# Altium integrated library Miscellaneous Devices LC.IntLib: 334 symbols (part 3 of 3)
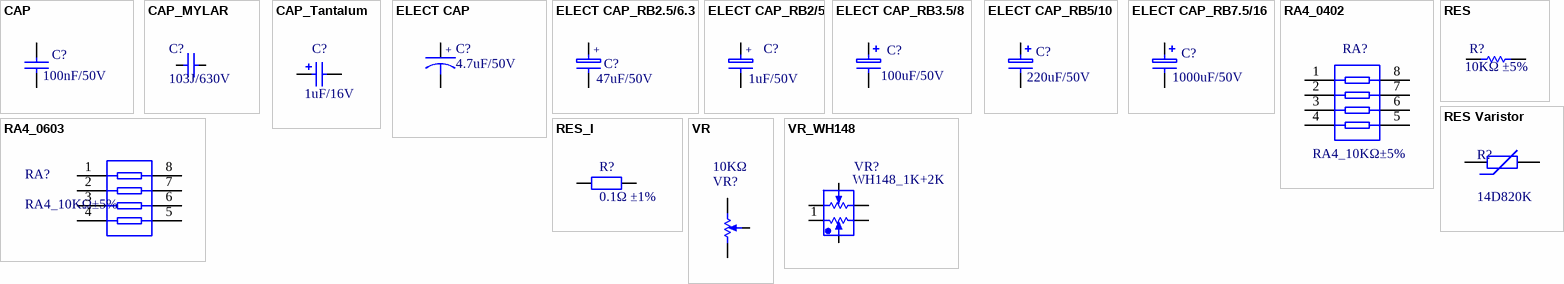
[diagram p33: symbols CAP to VR_WH148]

## ELECT CAP_RB3.5/8 
designator C?, comment 100uF/50V
电解电容
footprint RB3.5/8
pins: 1, 2

## ELECT CAP_RB5/10 
designator C?, comment 220uF/50V
电解电容
footprint RB5/10
pins: 1, 2

## ELECT CAP_RB7.5/16 
designator C?, comment 1000uF/50V
电解电容
footprint RB7.5/16
pins: 1, 2

## RA4_0402
designator RA?, comment RA4_10KΩ±5%
贴片排阻; ComponentLink1Description: 供应商链接; ComponentLink1URL: http://www.szlcsc.com/product/details_26468.html; Package: 0402*4; Supplier: LC; SuppliersPartNumber: C25725
footprint 0402_Rx4
pins: 1, 2, 3, 4, 5, 6, 7, 8

## RA4_0603
designator RA?, comment RA4_10KΩ±5%
贴片排阻; ComponentLink1Description: 供应商链接; ComponentLink1URL: http://www.szlcsc.com/product/details_30472.html; Package: 0603*4; Supplier: LC; SuppliersPartNumber: C29718
footprint 0603_Rx4
pins: 1, 2, 3, 4, 5, 6, 7, 8

## RES
designator R?, comment 10KΩ ±5%
贴片电阻; value: 1k
footprint 0805_R
footprint 0402_R
footprint 0603_R
footprint 1206_R
footprint AXIAL0.4-10mm
pins: 1, 2

## RES Varistor
designator R?, comment 14D820K
压敏电阻; Published: 24-Mar-1999; LatestRevisionDate: 29-May-2009; LatestRevisionNote: IPC-7351 Footprint Added.; PackageVersion: Mar-2003; PackageReference: 6-0805; Publisher: Altium Limited; PackageDescription: Chip Resistor 0805 Case Size; Code_IPC: RESC2012
footprint 14DXXXK
pins: 1, 2

## RES_I
designator R?, comment 0.1Ω ±1%
贴片取样电阻; ComponentLink1Description: 供应商链接; ComponentLink1URL: http://www.szlcsc.com/product/details_18590.html; Package: 1206; Supplier: LC; SuppliersPartNumber: C17902
footprint 1206_R
footprint 2512_R
footprint 1210_R
pins: 1, 2

## VR
designator VR?, comment 10KΩ
可调电阻; ComponentLink1Description: 生产商链接; ComponentLink1URL: http://www.bochen-gs.com/products_detail/productId=266.html
footprint VR_3362P (BOCHEN_3362P)
footprint VR5
footprint VR2
footprint VR_3296W
pins: 1, 2, 3

## VR_WH148
designator VR?, comment WH148_1K+2K
B型双联电位器; ComponentLink1Description: 生产商链接; ComponentLink1URL: http://www.bochen-gs.com/products_detail/productId=266.html
footprint CZ_B
footprint CZA100067
pins: 1, 2, 3, 4, 5, 6


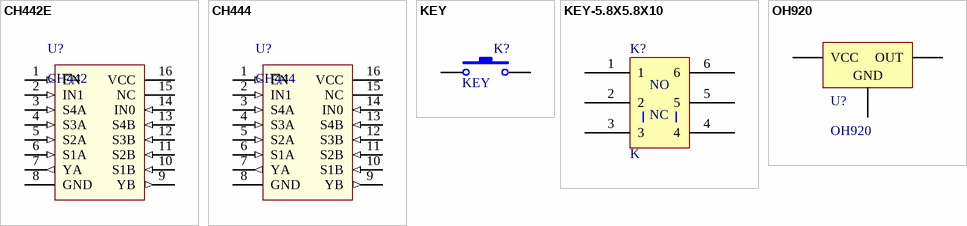
[diagram p24: symbols CH442E to OH920]

## CH442E
designator U?, comment CH442
2 路 2选1模拟开关
footprint SOP-16_150mil_W
pins: 1 ~{E}N (in), 2 IN1 (in), 3 S4A (in), 4 S3A (in), 5 S2A (in), 6 S1A (in), 7 YA (out), 8 GND (power), 9 YB (out), 10 S1B (in), 11 S2B (in), 12 S3B (in), 13 S4B (in), 14 IN0 (in), 15 NC, 16 VCC (power)

## CH444
designator U?
2 通道四选1模拟开关; ComponentLink1Description: 贸易商; ComponentLink1URL: https://item.szlcsc.com/87590.html; ComponentLink2Description: 南京沁恒; ComponentLink2URL: http://wch.cn/products/CH440_2_3_4.html
footprint SOP-16_150mil_W
pins: 1 ~{E}N (in), 2 IN1 (in), 3 S4A (in), 4 S3A (in), 5 S2A (in), 6 S1A (in), 7 YA (out), 8 GND (power), 9 YB (out), 10 S1B (in), 11 S2B (in), 12 S3B (in), 13 S4B (in), 14 IN0 (in), 15 NC, 16 VCC (power)

## KEY
designator K?
Published: 24-Mar-1999; LatestRevisionDate: 17-Jul-2002
footprint KEY
pins: 1, 2
2 alternate drawings of the same symbol

## KEY-5.8X5.8X10
designator K?, comment K
5.8mm*5.8mm*10mm
footprint KEY-5.8X5.8 (按键开关带自锁)
pins: 1, 2, 3, 4, 5, 6
text: NO; NC

## OH920
designator U?
霍尔开关; ComponentLink1Description: 供应商链接; ComponentLink1URL: http://www.szlcsc.com/product/details_5896.html; Package: SOT-23; Supplier: LC; SuppliersPartNumber: C5446
footprint SOT-23-3L (http://www.aosmd.com/res/packaging_information/SOT-23-3L.pdf)
pins: 1 VCC, 2 OUT, 3 GND


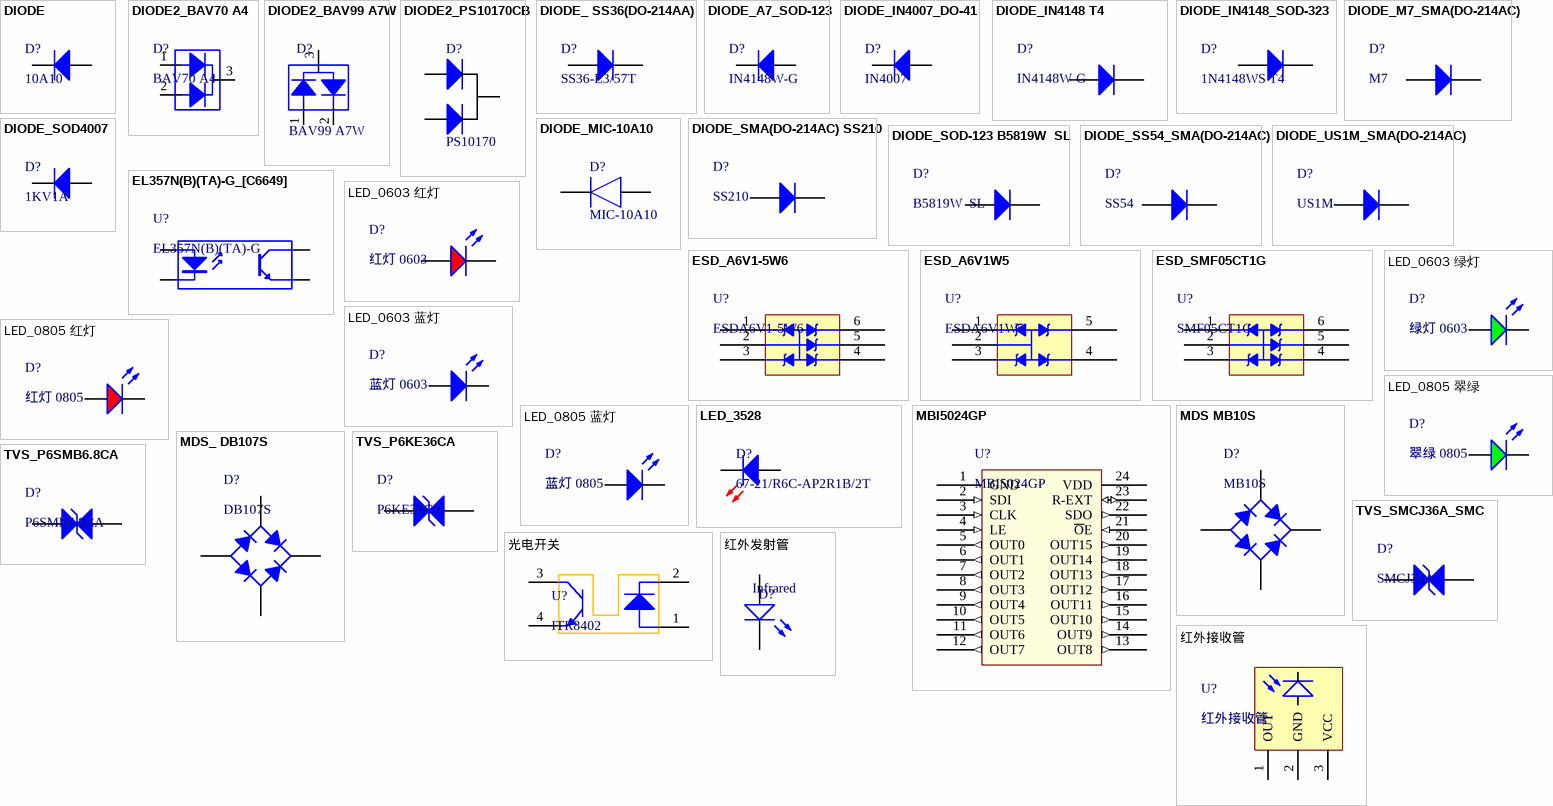
[diagram p25: symbols DIODE to 红外接收管]

## DIODE
designator D?, comment 10A10
二极管; 备注: 1N4007 4007 编号C2464 已经停售, 使用新物料编号C95872; ComponentLink1Description: 供应商链接; ComponentLink1URL: http://www.szlcsc.com/product/details_2841.html; Package: SMA(DO-214AC); Supplier: LC; SuppliersPartNumber: C95872
footprint R-6-17MM
pins: 1 A, 2 K

## DIODE2_BAV70 A4
designator D?, comment BAV70 A4
开关二极管; ComponentLink1Description: 供应商链接; ComponentLink1URL: http://www.szlcsc.com/product/details_70091.html; Package: SOT-23; Supplier: LC; SuppliersPartNumber: C68978
footprint SOT-23-3W
pins: 1 A, 2 A, 3 K

## DIODE2_BAV99 A7W
designator D?, comment BAV99 A7W
开关二极管; ComponentLink1Description: 供应商链接; ComponentLink1URL: http://www.szlcsc.com/product/details_2877.html; Package: SOT-23; Supplier: LC; SuppliersPartNumber: C2500
footprint SOT-23-3W
pins: 1 A, 2 A, 3 K

## DIODE2_PS10170CB
designator D?, comment PS10170
复合二极管; ComponentLink1Description: 网络链接; ComponentLink1URL: http://item.szlcsc.com/166994.html
footprint TO-252-2
pins: 1, 2, 3

## DIODE_ SS36(DO-214AA)
designator D?, comment SS36-E3/57T
二极管; ComponentLink1Description: 供应商链接; ComponentLink1URL: http://www.szlcsc.com/product/details_36698.html; Package: SMC(DO-214AB); Supplier: LC; SuppliersPartNumber: C35722
footprint DO-214AA/SMB
pins: 1 A, 2 K

## DIODE_A7_SOD-123
designator D?, comment IN4148W-G
开关二极管; 备注: 1N4007 4007 编号C2464 已经停售, 使用新物料编号C95872; ComponentLink1Description: 供应商链接; ComponentLink1URL: http://www.szlcsc.com/product/details_2841.html; Package: SMA(DO-214AC); Supplier: LC; SuppliersPartNumber: C95872
footprint SOD-123
pins: 1 A, 2 K

## DIODE_IN4007_DO-41
designator D?, comment IN4007
二极管
footprint DO-41
pins: 1 A, 2 K

## DIODE_IN4148 T4
designator D?, comment IN4148W-G
开关二极管; ComponentLink1Description: 供应商链接; ComponentLink1URL: http://www.szlcsc.com/product/details_10338.html; Package: LL-34; Supplier: LC; SuppliersPartNumber: C9808
footprint LL-34
pins: 1 A, 2 K

## DIODE_IN4148_SOD-323
designator D?, comment 1N4148WS T4
二极管; ComponentLink1Description: 供应商链接; ComponentLink1URL: http://www.szlcsc.com/product/details_2485.html; Package: SOD-323; Supplier: LC; SuppliersPartNumber: C2128
footprint SOD-323
pins: 1 A, 2 K

## DIODE_M7_SMA(DO-214AC)
designator D?, comment M7
二极管; 备注: 1N4007 4007 编号C2464 已经停售, 使用新物料编号C95872; ComponentLink1Description: 供应商链接; ComponentLink1URL: http://www.szlcsc.com/product/details_2841.html; Package: SMA(DO-214AC); Supplier: LC; SuppliersPartNumber: C95872
footprint SMA(DO-214AC)
pins: 1 A, 2 K

## DIODE_MIC-10A10
designator D?, comment MIC-10A10
Diode 10A 1000V; Manufacturer_Name: STMicroelectronics; Manufacturer_Part_Number: BZW50-27; Allied_Number: 70389896; RS Part Number: 7147033; RS Price/Stock: http://uk.rs-online.com/web/p/tvs-diodes/7147033/?source=DS; Allied Price/Stock: http://www.alliedelec.com/stmicroelectronics-bzw50-27/70389896/; Arrow Part Number: BZW50-27; Arrow Price/Stock: https://www.arrow.com/en/products/bzw50-27/stmicroelectronics; Datasheet Link: http://www.st.com/web/en/resource/technical/document/datasheet/CD00000695.pdf
footprint R-6
pins: 1 K, 2 A

## DIODE_SMA(DO-214AC) SS210
designator D?, comment SS210
二极管; ComponentLink1Description: 供应商链接; ComponentLink1URL: http://www.szlcsc.com/product/details_15669.html; Package: SMA(DO-214AC); Supplier: LC; SuppliersPartNumber: C14996
footprint SMA(DO-214AC)_S1
pins: 1 A, 2 K

## DIODE_SOD4007
designator D?, comment 1KV1A
二极管; 备注: 1N4007 4007 编号C2464 已经停售, 使用新物料编号C95872; Package: SMA(DO-214AC); Supplier: LC; SuppliersPartNumber: C95872; ComponentLink1Description: 供应商; ComponentLink1URL: https://so.szlcsc.com/global.html?os=&sb=0&pn=1&c=&k=4007&tc=0&pds=SOD-123F&pa=0&gp=211&st=&sk=4007&bp=&ep=&pageNumber=1
footprint SOD-123F_A7
pins: 1 A, 2 K

## DIODE_SOD-123 B5819W  SL
designator D?, comment B5819W  SL
肖特基二极管; ComponentLink1Description: 供应商链接; ComponentLink1URL: http://www.szlcsc.com/product/details_9093.html; Package: SOD-123; Supplier: LC; SuppliersPartNumber: C8598
footprint SOD-123
pins: 1 A, 2 K

## DIODE_SS54_SMA(DO-214AC)
designator D?, comment SS54
二极管; ComponentLink1Description: 供应商链接; ComponentLink1URL: http://www.szlcsc.com/product/details_23178.html; Package: SMA(DO-214AC); Supplier: LC; SuppliersPartNumber: C22452
footprint SMA(DO-214AC)_S1
pins: 1 A, 2 K

## DIODE_US1M_SMA(DO-214AC)
designator D?, comment US1M
二极管; ComponentLink1Description: 供应商链接; ComponentLink1URL: http://www.szlcsc.com/product/details_5885.html; Package: SMA(DO-214AC); Supplier: LC; SuppliersPartNumber: C5441
footprint SMA(DO-214AC)_S1
pins: 1 A, 2 K

## EL357N(B)(TA)-G_[C6649]
designator U?, comment EL357N(B)(TA)-G
贴片光耦; ComponentLink1Description: 供应商链接; ComponentLink1URL: http://www.szlcsc.com/product/details_7114.html; Package: SOP-4_P2.54; Supplier: LC; SuppliersPartNumber: C6649
footprint SOP-4_P2.54
pins: 1 A "Anode", 2 K "Cathode", 3 E "Emitter", 4 C "Collector"

## ESD_A6V1-5W6
designator U?, comment ESDA6V1-5W6
ESD静电保护管; ComponentLink1Description: 供应商链接; ComponentLink1URL: http://www.szlcsc.com/product/details_16561.html; Package: SC-70-6(SOT-363); Supplier: LC; SuppliersPartNumber: C15879
footprint SOT-323-6L (E62)
pins: 1, 2, 3, 4, 5, 6

## ESD_A6V1W5
designator U?, comment ESDA6V1W5
ESD静电保护管; Package: SC-70-6(SOT-363); Supplier: LC; SuppliersPartNumber: C15879; ComponentLink1Description: 供应商; ComponentLink1URL: https://item.szlcsc.com/49685.html
footprint SOT-323-5L (E61)
pins: 1, 2, 3, 4, 5

## ESD_SMF05CT1G
designator U?, comment SMF05CT1G
ESD静电保护管; ComponentLink1Description: 供应商链接; ComponentLink1URL: http://www.szlcsc.com/product/details_16561.html; Package: SC-70-6(SOT-363); Supplier: LC; SuppliersPartNumber: C15879
footprint SC-70-6(SOT-363)
pins: 1, 2, 3, 4, 5, 6

## LED_0603 红灯
designator D?, comment 红灯 0603
发光二极管; ComponentLink1Description: 供应商链接; ComponentLink1URL: http://www.szlcsc.com/product/details_2659.html; Package: 0603; Supplier: LC; SuppliersPartNumber: C2286
footprint 0603_LED
pins: A, K

## LED_0603 绿灯
designator D?, comment 绿灯 0603
发光二极管; ComponentLink1Description: 供应商链接; ComponentLink1URL: http://www.szlcsc.com/product/details_73152.html; Package: 0603; Supplier: LC; SuppliersPartNumber: C72043
footprint 0603_LED
pins: A, K

## LED_0603 蓝灯
designator D?, comment 蓝灯 0603
发光二极管; ComponentLink1Description: 供应商链接; ComponentLink1URL: http://www.szlcsc.com/product/details_73150.html; Package: 0603; Supplier: LC; SuppliersPartNumber: C72041
footprint 0603_LED
pins: A, K

## LED_0805 红灯
designator D?, comment 红灯 0805
发光二极管; ComponentLink1Description: 供应商链接; ComponentLink1URL: http://www.szlcsc.com/product/details_2668.html; Package: 0805; Supplier: LC; SuppliersPartNumber: C2295
footprint 0805_LED_S1
footprint LED 5MM RED
pins: A, K

## LED_0805 翠绿
designator D?, comment 翠绿 0805
发光二极管; ComponentLink1Description: 供应商链接; ComponentLink1URL: http://www.szlcsc.com/product/details_2670.html; Package: 0805; Supplier: LC; SuppliersPartNumber: C2297
footprint 0805_LED_S1
pins: A, K

## LED_0805 蓝灯
designator D?, comment 蓝灯 0805
发光二极管; ComponentLink1Description: 供应商链接; ComponentLink1URL: http://www.szlcsc.com/product/details_2666.html; Package: 0805; Supplier: LC; SuppliersPartNumber: C2293
footprint 0805_LED_S1
pins: A, K

## LED_3528
designator D?, comment 67-21/R6C-AP2R1B/2T
发光二极管; ComponentLink1Description: 供应商链接; ComponentLink1URL: https://item.szlcsc.com/75469.html; Package: 0805; Supplier: LC; SuppliersPartNumber: C2293; ComponentLink2Description: 生产商; ComponentLink2URL: https://www.everlight.com/SeriationProduct.aspx?Seq=B3D6B83A-2405-E411-8B3B-0002A54E500F
footprint 3528X19N_LED (Molded Diode, 2-Leads, Body 3.10x2.20mm, IPC Medium Density)
footprint LED 5MM RED
pins: A, K

## MBI5024GP
designator U?
LED驱动; ComponentLink1Description: 贸易商; ComponentLink1URL: https://item.szlcsc.com/83753.html
footprint SSOP-24L-150mil-0.64 (SOP, 24-Leads, Body 8.65x3.90mm, Pitch 0.64mm, IPC High Density)
pins: 1 GND (power), 2 SDI (in), 3 CLK (in), 4 LE (in), 5 OUT0 (out), 6 OUT1 (out), 7 OUT2 (out), 8 OUT3 (out), 9 OUT4 (out), 10 OUT5 (out), 11 OUT6 (out), 12 OUT7 (out), 13 OUT8 (out), 14 OUT9 (out), 15 OUT10 (out), 16 OUT11 (out), 17 OUT12 (out), 18 OUT13 (out), 19 OUT14 (out), 20 OUT15 (out), 21 ~{O}E (in), 22 SDO (out), 23 R-EXT (io), 24 VDD (power)

## MDS MB10S
designator D?, comment MB10S
整流桥; ComponentLink1Description: 供应商链接; ComponentLink1URL: http://www.szlcsc.com/product/details_2865.html; Package: MBS; Supplier: LC; SuppliersPartNumber: C2488
footprint MBS
pins: 1 C, 2 K, 3 C, 4 A

## MDS_ DB107S
designator D?, comment DB107S
整流桥; ComponentLink1Description: 供应商链接; ComponentLink1URL: http://www.szlcsc.com/product/details_5809.html; Package: DBS; Supplier: LC; SuppliersPartNumber: C5377
footprint DBS
pins: 1 C, 2 K, 3 C, 4 A

## TVS_P6KE36CA
designator D?, comment P6KE36CA
ComponentLink1Description: 供应商链接; ComponentLink1URL: http://www.szlcsc.com/product/details_79530.html; Package: SMB/DO-214AA; Supplier: LC; SuppliersPartNumber: C78395
footprint DO-15
pins: 1 A, 2 K

## TVS_P6SMB6.8CA
designator D?, comment P6SMB6.8CA
TVS SMB/DO-214AA; ComponentLink1Description: 供应商链接; ComponentLink1URL: http://www.szlcsc.com/product/details_79530.html; Package: SMB/DO-214AA; Supplier: LC; SuppliersPartNumber: C78395
footprint SMB(DO-214AA)
pins: 1 A, 2 K

## TVS_SMCJ36A_SMC
designator D?, comment SMCJ36A
ComponentLink1Description: 供应商链接; ComponentLink1URL: http://www.szlcsc.com/product/details_79530.html; Package: SMB/DO-214AA; Supplier: LC; SuppliersPartNumber: C78395
footprint SMB(DO-214AA)_S1
pins: 1 A, 2 K

## 光电开关
designator U?, comment ITR8402
ComponentLink1Description: 供应商链接; ComponentLink1URL: http://www.szlcsc.com/product/details_73150.html; Package: 0603; Supplier: LC; SuppliersPartNumber: C72041
footprint DIP-4_ITR8402 (光电开关)
pins: 1 A, 2 K, 3 C, 4 E

## 红外发射管
designator D?, comment Infrared
footprint RB01/02 (红外发射管)
pins: A, K

## 红外接收管
designator U?
ComponentLink1Description: 供应商链接; ComponentLink1URL: http://www.szlcsc.com/product/details_2663.html; Package: 0603; Supplier: LC; SuppliersPartNumber: C2290
footprint 红外接收管
pins: 1 OUT, 2 GND, 3 VCC


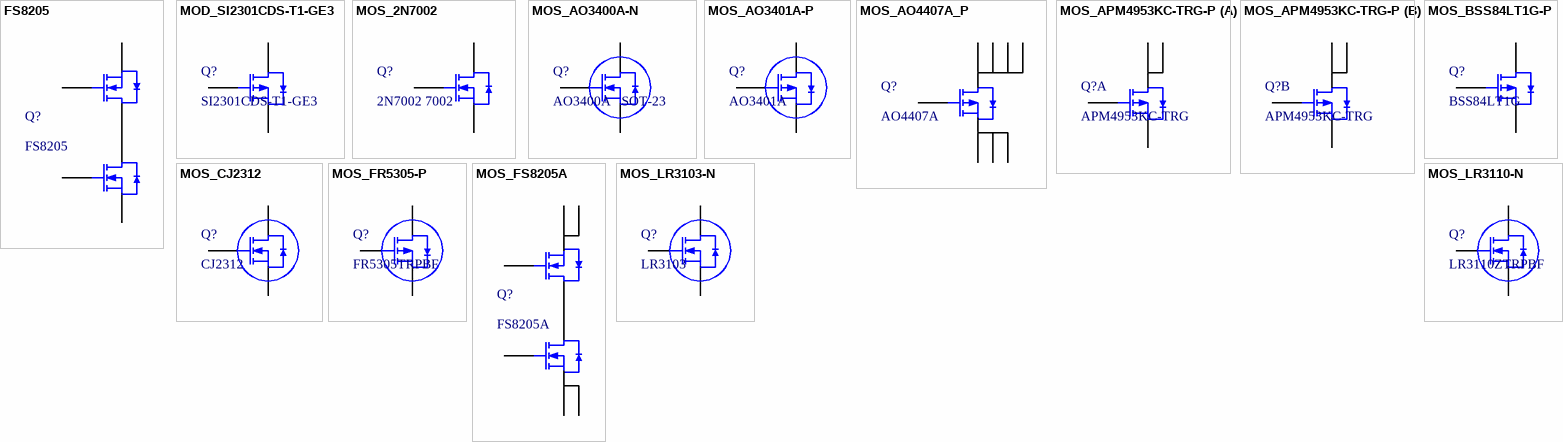
[diagram p26: symbols FS8205 to MOS_LR3110-N]

## FS8205
designator Q?
MOS(场效应管); ComponentLink1Description: 供应商链接; ComponentLink1URL: http://www.szlcsc.com/product/details_33217.html; Package: SOT-23-6; Supplier: LC; SuppliersPartNumber: C32254
footprint SOT-23-6
pins: 1 S, 2 D, 3 S, 4 G, 5 D, 6 G

## MOD_SI2301CDS-T1-GE3
designator Q?, comment SI2301CDS-T1-GE3
MOS(场效应管); ComponentLink1Description: 供应商链接; ComponentLink1URL: http://www.szlcsc.com/product/details_11030.html; Package: SOT-23(SOT-23-3); Supplier: LC; SuppliersPartNumber: C10487
footprint SOT-23(SOT-23-3)
pins: 1 G, 2 S, 3 D

## MOS_2N7002
designator Q?, comment 2N7002 7002
MOS(场效应管); ComponentLink1Description: 供应商链接; ComponentLink1URL: http://www.szlcsc.com/product/details_9040.html; Package: SOT-23(SOT-23-3); Supplier: LC; SuppliersPartNumber: C8545
footprint SOT-23-3
pins: 1 G, 2 S, 3 D

## MOS_AO3400A-N
designator Q?, comment AO3400A   SOT-23
MOS(场效应管)AO3400A N道沟 X0YV1T SOT-23; ComponentLink1Description: 供应商链接; ComponentLink1URL: http://www.szlcsc.com/product/details_21629.html; Package: SOT-23; Supplier: LC; SuppliersPartNumber: C20917
footprint SOT-23-3L (http://www.aosmd.com/res/packaging_information/SOT-23-3L.pdf)
pins: 1 G, 2 S, 3 D

## MOS_AO3401A-P
designator Q?, comment AO3401A
PMOS(场效应管)AO3401A P道沟 X13A15 SOT-23; ComponentLink1Description: 供应商链接; ComponentLink1URL: http://www.szlcsc.com/product/details_15801.html; Package: SOT-23; Supplier: LC; SuppliersPartNumber: C15127
footprint SOT-23-3L (http://www.aosmd.com/res/packaging_information/SOT-23-3L.pdf)
pins: 1 G, 2 S, 3 D

## MOS_AO4407A_P
designator Q?, comment AO4407A
MOS(场效应管); ComponentLink1Description: 供应商链接; ComponentLink1URL: http://www.szlcsc.com/product/details_16754.html; Package: SOIC-8_150mil; Supplier: LC; SuppliersPartNumber: C16072
footprint SOIC-8_150mil
pins: 1 S, 2 S, 3 S, 4 G, 5 D, 6 D, 7 D, 8 D

## MOS_APM4953KC-TRG-P
designator Q?, comment APM4953KC-TRG
MOS(场效应管); ComponentLink1Description: 供应商链接; ComponentLink1URL: http://www.szlcsc.com/product/details_21609.html; Package: SOP-8_150mil; Supplier: LC; SuppliersPartNumber: C20897
footprint SOP-8_150mil
part A pins: 1 S, 2 G, 7 D, 8 D
part B pins: 3 S, 4 G, 5 D, 6 D

## MOS_BSS84LT1G-P
designator Q?, comment BSS84LT1G
MOS(场效应管); ComponentLink1Description: 供应商链接; ComponentLink1URL: http://www.szlcsc.com/product/details_8986.html; Package: SOT-23(SOT-23-3); Supplier: LC; SuppliersPartNumber: C8492
footprint SOT-23(SOT-23-3)
pins: 1 G, 2 S, 3 D

## MOS_CJ2312
designator Q?, comment CJ2312
NMOS(场效应管); Package: SOT-23; Supplier: LC; SuppliersPartNumber: C20917; ComponentLink1Description: 供应商; ComponentLink1URL: https://so.szlcsc.com/global.html?k=CJ231
footprint SOT-23-3
pins: 1 G, 2 S, 3 D

## MOS_FR5305-P
designator Q?, comment FR5305TRPBF
PMOS(场效应管); ComponentLink1Description: 供应商链接; ComponentLink1URL: https://item.szlcsc.com/3002.html; Package: SOT-23; Supplier: LC; SuppliersPartNumber: C15127
footprint TO-252AA
pins: 1 G, 3 S, 4 D

## MOS_FS8205A
designator Q?, comment FS8205A
MOS(场效应管); ComponentLink1Description: 供应商链接; ComponentLink1URL: http://www.szlcsc.com/product/details_16734.html; Package: TSSOP-8_3x4.4x065P; Supplier: LC; SuppliersPartNumber: C16052
footprint TSSOP-8_3x4.4x065P
pins: 1 D, 2 S, 3 S, 4 G, 5 G, 6 S, 7 S, 8 D

## MOS_LR3103-N
designator Q?, comment LR3103
NMOS(场效应管); ComponentLink1Description: 供应商链接; ComponentLink1URL: http://www.szlcsc.com/product/details_21629.html; Package: SOT-23; Supplier: LC; SuppliersPartNumber: C20917
footprint TO-252AA
pins: 1 G, 3 S, 4 D

## MOS_LR3110-N
designator Q?, comment LR3110ZTRPBF
NMOS(场效应管); ComponentLink1Description: 供应商链接; ComponentLink1URL: http://www.szlcsc.com/product/details_21629.html; Package: SOT-23; Supplier: LC; SuppliersPartNumber: C20917
footprint TO-252AA
pins: 1 G, 3 S, 4 D


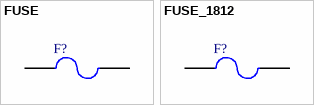
[diagram p27: symbols FUSE to FUSE_1812]

## FUSE
designator F?, comment 30A  (value not drawn)
Fuse_GF-C40; Published: 8-Jun-2000; LatestRevisionDate: 17-Jul-2002; LatestRevisionNote: Re-released for DXP Platform.; PackageReference: PIN-W2/E2.8; Publisher: Altium Limited; ComponentLink1Description: 产品网络链接; ComponentLink1URL: http://www.fuse111.com/product.asp?plt=130&pone=7
footprint FUSE_GF-C40
pins: 1, 2

## FUSE_1812
designator F?, comment 1.5A  (value not drawn)
贴片保险丝150; Published: 8-Jun-2000; LatestRevisionDate: 17-Jul-2002; LatestRevisionNote: Re-released for DXP Platform.; PackageReference: PIN-W2/E2.8; Publisher: Altium Limited; ComponentLink1Description: 网络链接; ComponentLink1URL: http://item.szlcsc.com/146673.html
footprint 1812_L
pins: 1, 2


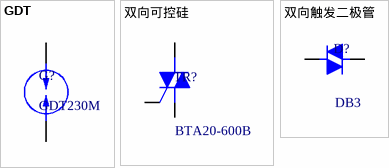
[diagram p28: symbols GDT to 双向触发二极管]

## GDT
designator G?, comment GDT230M
陶瓷气体放电管; ComponentLink1Description: 供应商链接; ComponentLink1URL: http://www.szlcsc.com/product/details_2507.html; Package: SOT-23; Supplier: LC; SuppliersPartNumber: C2150
footprint AXIAL0.8-GDT (Footprint not found)
pins: 1, 2

## 双向可控硅
designator TR?, comment BTA20-600B
footprint TO-220ABC-3P
pins: 1 A1, 2 A2, 3 G

## 双向触发二极管
designator D?, comment DB3
ST DB3 C321
footprint DO-35_DB3
pins: 1 K, 2 A


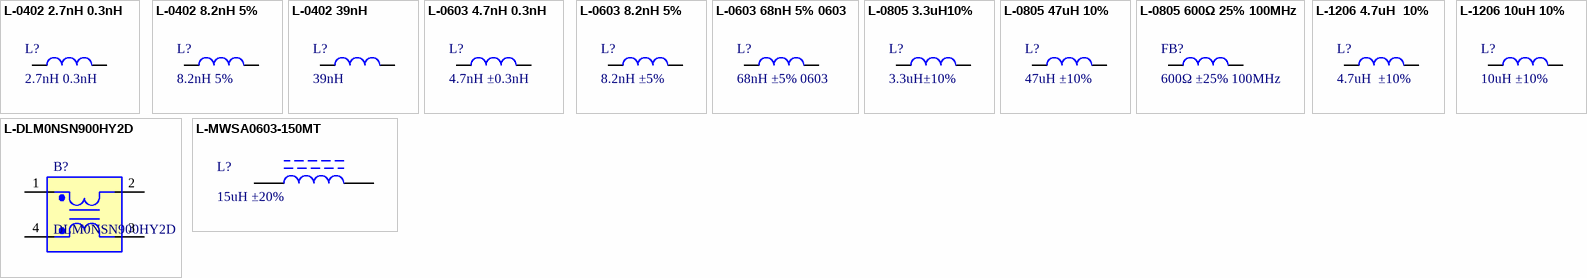
[diagram p29: symbols L-0402 2.7nH 0.3nH to L-MWSA0603-150MT]

## L-0402 2.7nH 0.3nH
designator L?, comment 2.7nH 0.3nH
贴片电感; ComponentLink1Description: 供应商链接; ComponentLink1URL: http://www.szlcsc.com/product/details_27872.html; Package: 0402; Supplier: LC; SuppliersPartNumber: C27123
footprint 0402_L
pins: 1, 2

## L-0402 8.2nH 5%
designator L?, comment 8.2nH 5%
贴片电感; ComponentLink1Description: 供应商链接; ComponentLink1URL: http://www.szlcsc.com/product/details_16890.html; Package: 0402; Supplier: LC; SuppliersPartNumber: C16208
footprint 0402_L
pins: 1, 2

## L-0402 39nH
designator L?, comment 39nH
贴片电感; ComponentLink1Description: 供应商链接; ComponentLink1URL: http://www.szlcsc.com/product/details_27187.html; Package: 0402; Supplier: LC; SuppliersPartNumber: C26443
footprint 0402_L
pins: 1, 2

## L-0603 4.7nH 0.3nH
designator L?, comment 4.7nH ±0.3nH
贴片电感; ComponentLink1Description: 供应商链接; ComponentLink1URL: http://www.szlcsc.com/product/details_1382.html; Package: 0603; Supplier: LC; SuppliersPartNumber: C1030
footprint 0603_L
pins: 1, 2

## L-0603 8.2nH 5%
designator L?, comment 8.2nH ±5%
贴片电感; ComponentLink1Description: 供应商链接; ComponentLink1URL: http://www.szlcsc.com/product/details_1384.html; Package: 0603; Supplier: LC; SuppliersPartNumber: C1032
footprint 0603_L
pins: 1, 2

## L-0603 68nH 5% 0603
designator L?, comment 68nH ±5% 0603
贴片电感; ComponentLink1Description: 供应商链接; ComponentLink1URL: http://www.szlcsc.com/product/details_14064.html; Package: 0603; Supplier: LC; SuppliersPartNumber: C13415
footprint 0603_L
pins: 1, 2

## L-0805 3.3uH10%
designator L?, comment 3.3uH±10%
贴片电感; ComponentLink1Description: 供应商链接; ComponentLink1URL: http://www.szlcsc.com/product/details_52738.html; Package: 0805; Supplier: LC; SuppliersPartNumber: C51725
footprint 0805_L
pins: 1, 2

## L-0805 47uH 10%
designator L?, comment 47uH ±10%
贴片电感; ComponentLink1Description: 供应商链接; ComponentLink1URL: http://www.szlcsc.com/product/details_14964.html; Package: 0805; Supplier: LC; SuppliersPartNumber: C14304
footprint 0805_L
pins: 1, 2

## L-0805 600Ω 25% 100MHz
designator FB?, comment 600Ω ±25% 100MHz
贴片磁珠; ComponentLink1Description: 供应商链接; ComponentLink1URL: http://www.szlcsc.com/product/details_1369.html; Package: 0805; Supplier: LC; SuppliersPartNumber: C1017
footprint 0805_L
pins: 1, 2

## L-1206 4.7uH  10%
designator L?, comment 4.7uH  ±10%
贴片电感; ComponentLink1Description: 供应商链接; ComponentLink1URL: http://www.szlcsc.com/product/details_1401.html; Package: 1206; Supplier: LC; SuppliersPartNumber: C1049
footprint 1206_L
pins: 1, 2

## L-1206 10uH 10%
designator L?, comment 10uH ±10%
贴片电感; ComponentLink1Description: 供应商链接; ComponentLink1URL: http://www.szlcsc.com/product/details_1403.html; Package: 1206; Supplier: LC; SuppliersPartNumber: C1051
footprint 1206_L
pins: 1, 2

## L-DLM0NSN900HY2D
designator B?, comment DLM0NSN900HY2D
Common Mode Chokes / Filters; Manufacturer_Name: Murata Electronics; Geometry.Height: 0.5mm; Manufacturer_Part_Number: DLM0NSN900HY2D; Mouser Part Number: 81-DLM0NSN900HY2D; Mouser Price/Stock: https://www.mouser.com/Search/Refine.aspx?Keyword=81-DLM0NSN900HY2D; RS Part Number: *; RS Price/Stock: *; Datasheet Link: https://www.murata.com/en-us/products/productdata/8799424610334/EFLD0009.pdf?1536847210000
footprint DLM0NSN900HY2D
footprint DLM11SN450HY2L
pins: 1, 2, 3, 4

## L-MWSA0603-150MT
designator L?, comment 15uH ±20%
功率电感; Package: 1206; Supplier: LC; SuppliersPartNumber: C1051; ComponentLink1Description: 产品销售接; ComponentLink1URL: http://item.szlcsc.com/143435.html; ComponentLink2Description: 公司链接; ComponentLink2URL: http://www.sunlordinc.com/PDFCatalog.aspx#WPN
footprint SMD_MWSA0603_15MT (顺络电子)
pins: 1, 2


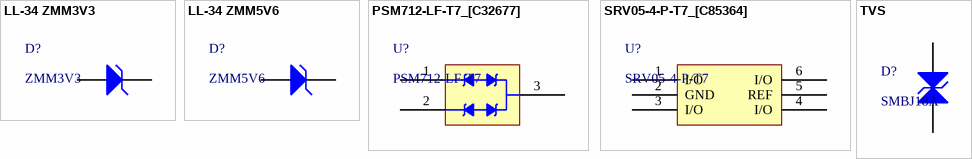
[diagram p30: symbols LL-34 ZMM3V3 to TVS]

## LL-34 ZMM3V3
designator D?, comment ZMM3V3
稳压二极管; ComponentLink1Description: 供应商链接; ComponentLink1URL: http://www.szlcsc.com/product/details_8535.html; Package: LL-34; Supplier: LC; SuppliersPartNumber: C8056
footprint LL-34
pins: 1 A, 2 K

## LL-34 ZMM5V6
designator D?, comment ZMM5V6
稳压二极管; ComponentLink1Description: 供应商链接; ComponentLink1URL: http://www.szlcsc.com/product/details_8541.html; Package: LL-34; Supplier: LC; SuppliersPartNumber: C8062
footprint LL-34
pins: 1 A, 2 K

## PSM712-LF-T7_[C32677]
designator U?, comment PSM712-LF-T7
TVS; ComponentLink1Description: 供应商链接; ComponentLink1URL: http://www.szlcsc.com/product/details_33642.html; Package: SOT-23(SOT-23-3); Supplier: LC; SuppliersPartNumber: C32677
footprint SOT-23(SOT-23-3)
pins: 1, 2, 3

## SRV05-4-P-T7_[C85364]
designator U?, comment SRV05-4-P-T7
TVS; ComponentLink1Description: 供应商链接; ComponentLink1URL: http://www.szlcsc.com/product/details_86537.html; Package: SOT-23-6; Supplier: LC; SuppliersPartNumber: C85364
footprint SOT-23-6
pins: 1 I/O , 2 GND, 3 I/O, 4 I/O, 5 REF, 6 I/O

## TVS
designator D?, comment SMBJ18A
瞬态抑制二极管; Package: LL-34; Supplier: LC; SuppliersPartNumber: C8056; ComponentLink1Description: 供应商; ComponentLink1URL: http://item.szlcsc.com/144974.html
footprint SMB(DO-214AA)_S2
pins: 1 A, 2 K


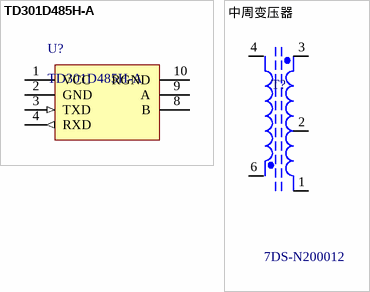
[diagram p31: symbols TD301D485H-A to 中周变压器]

## TD301D485H-A
designator U?
ComponentLink1Description: 生产商; ComponentLink1URL: https://www.mornsun.cn/html/product/content/TDx01D485H-A.html
footprint TD301D485H-A
pins: 1 VCC (power), 2 GND (power), 3 TXD (in), 4 RXD (out), 8 B (power), 9 A (power), 10 RGND (power)

## 中周变压器
designator T?, comment 7DS-N200012
中周变压器; ComponentLink1Description: 中周变压器; ComponentLink1URL: http://www.liheng-dg.cn/content/?233.html
footprint BYQ_ZZ (中周变压器)
pins: 1, 2, 3, 4, 6